# Altium footprint library Lib_001.PcbLib: 429 footprints (part 13 of 28)
Each footprint in its own frame and in the unit in brackets; x right, y up, seen from the top. Pads: shape width x height; smd on the part's side, far side on the other; paste and mask are expansions set on the pad; w line width, h text height; cw(c..) or ccw(c..) is an arc to the next point about the centre after c.
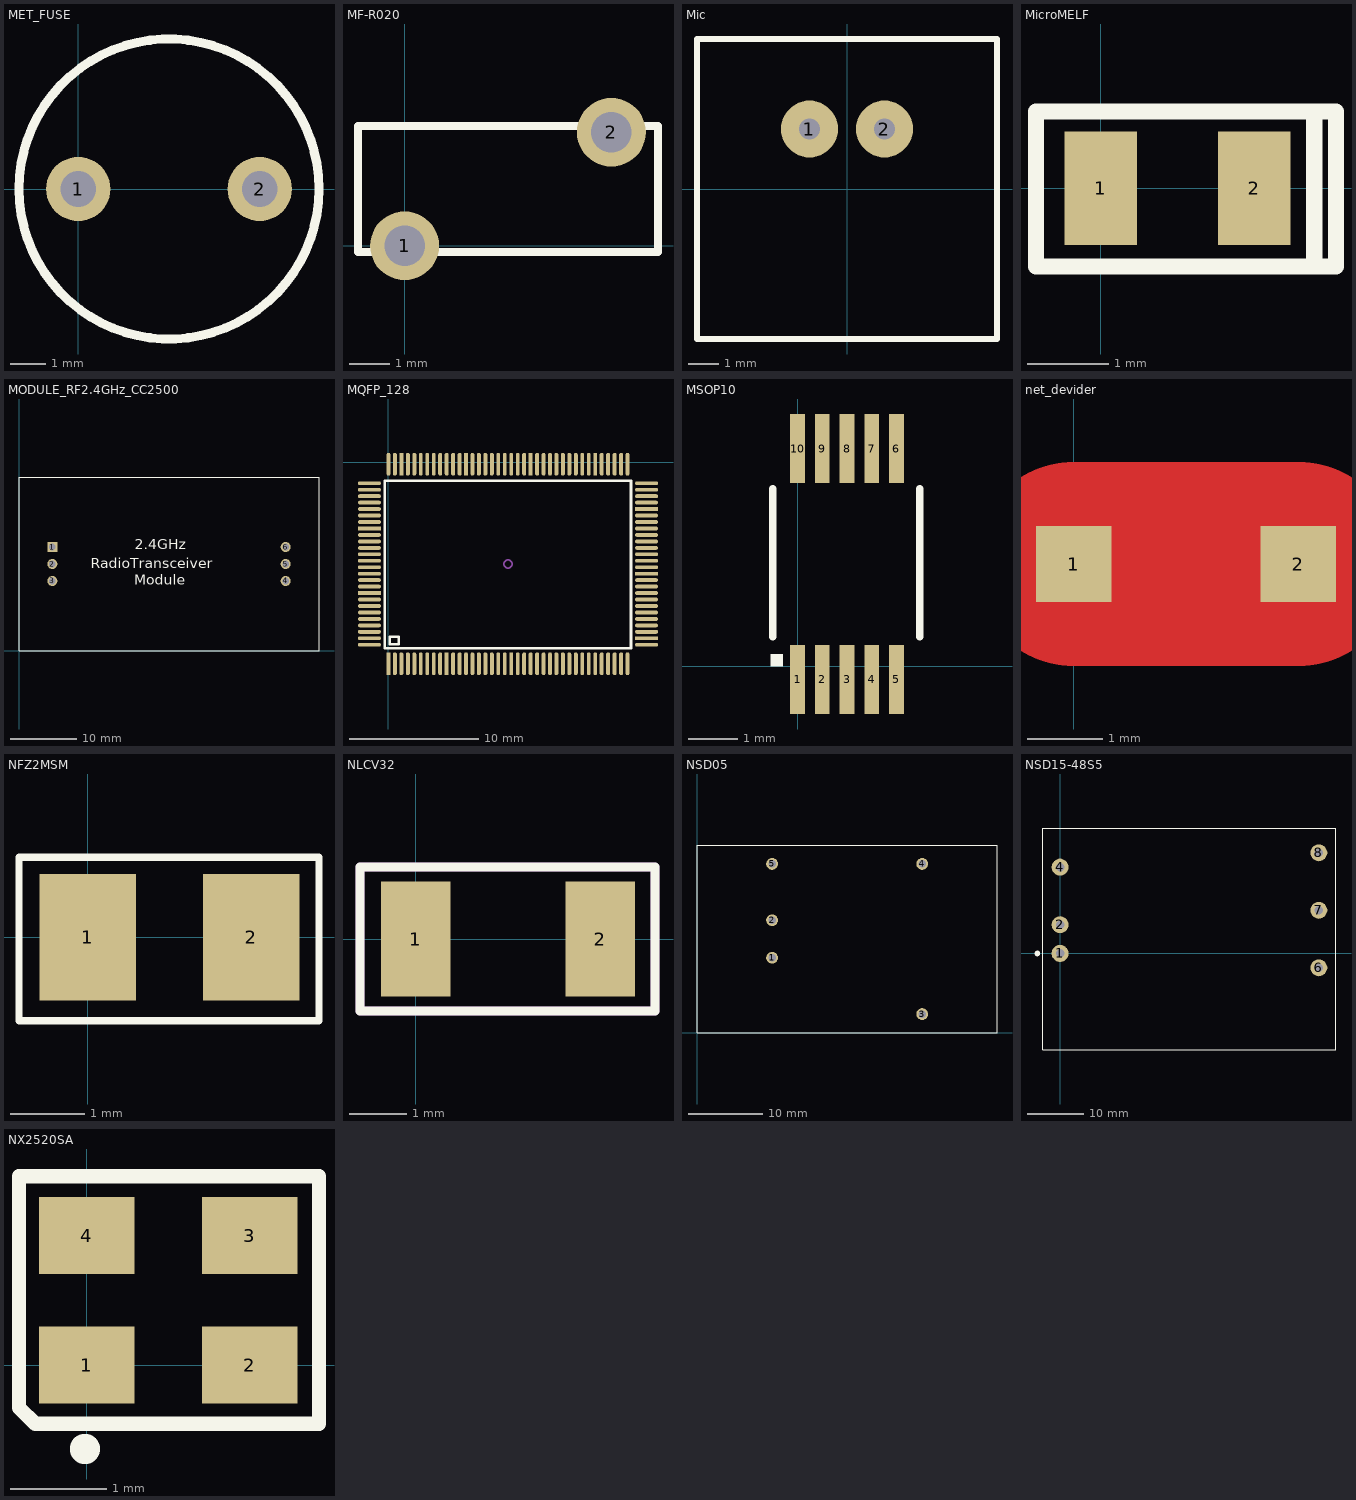
[diagram p12: the footprints below, top view; thin cyan lines are the x and y axes]

## MECH_radiator_90x18 [mm]
height 12
3D body "Радиатор_MIS.STEP": height 18.2, standoff 1.2, extent 0.004,0.01 90.004,18.01

## MECH_radiator_G30x10 [mm]
height 20
3D body "Радиатор_Г30х10.STEP": height 20, standoff 0, extent -31,0 0,11

## MECH_radiator_R30x10 [mm]
height 20
3D body "Радиатор_Р30х10.STEP": height 20, standoff 0, extent 0,0 30,12

## MET_FUSE [mm] "8х8 мм, Предохранитель"
pads (2):
  round 1.8 hole 1: 1(0,0) 2(5.08,0)
Top Overlay:
  circle w0.254: c2.54,0 r4.2
3D body: height 10.7, standoff 3, extent -1.627,-4.192 6.74,4.192
3D body: height 4, standoff -1, extent -0.307,-0.309 0.31,0.31
3D body: height 4, standoff -1, extent 4.773,-0.309 5.39,0.31

## MF-R020 [mm]
pads (2):
  round 1.7 hole 1: 1(0,0) 2(5.1,2.8)
Top Overlay:
  lines w0.2: -1.15,-0.15 6.25,-0.15 6.25,1.4 6.25,2.95 -1.15,2.95 -1.15,1.4 -1.15,-0.15

## Mic [mm] "Microphone"
pads (2):
  round 1.9 hole 0.7: 1(-1.25,2) 2(1.25,2)
Top Overlay:
  lines w0.2: -5,-5 5,-5 5,5 -5,5 -5,-5
3D body "CMA-4544.step": height 5.6, standoff -3.5, extent -4.85,-4.85 4.848,4.848

## MicroMELF [mm]
pads (2):
  rect 0.9x1.4 smd: 1(0,0) 2(1.9,0)
Top Overlay:
  lines w0.2: 2.64,-0.96 2.64,0.92 ; -0.8,-0.97 2.91,-0.97 2.91,0.95 -0.8,0.95 -0.8,-0.97
3D body "User Library-MicroMelf.step": height 1.17, standoff 0.03, extent -0.015,-0.57 1.915,0.573

## MODULE_RF2.4GHz_CC2500 [mm]
pads (6):
  rect 1.5x1.5 hole 1: 1(5,15.54)
  round 1.5 hole 1: 2(5,13) 3(5,10.46) 4(40,10.46) 5(40,13) 6(40,15.54)
Top Overlay:
  lines w0.1: 0,0 0,26 45,26 45,0 0,0
  text "2.4GHz" at 17.36,15.22 h1.52
  text "RadioTransceiver" at 10.75,12.36 h1.52
  text "Module" at 17.32,9.9 h1.52

## MQFP_128 [mil]
pads (128):
  rect 11.81x70 smd: 1(1.3,-615.24) 10(178.6,-615.24) 20(375.6,-615.24) 70(631.7,-6.74) 80(434.7,-6.74) 90(237.7,-6.74) 100(40.7,-6.74)
  oval 11.81x70 smd: 2(21,-615.24) 3(40.7,-615.24) 4(60.4,-615.24) 5(80.1,-615.24) 6(99.8,-615.24) 7(119.5,-615.24) 8(139.2,-615.24) 9(158.9,-615.24) 11(198.3,-615.24) 12(218,-615.24) 13(237.7,-615.24) 14(257.4,-615.24) 15(277.1,-615.24) 16(296.8,-615.24) 17(316.5,-615.24) 18(336.2,-615.24) 19(355.9,-615.24) 21(395.3,-615.24) 22(415,-615.24) 23(434.7,-615.24) 24(454.4,-615.24) 25(474.1,-615.24) 26(493.8,-615.24) 27(513.5,-615.24) 28(533.2,-615.24) 29(552.9,-615.24) 30(572.6,-615.24) 31(592.3,-615.24) 32(612,-615.24) 33(631.7,-615.24) 34(651.4,-615.24) 35(671.1,-615.24) 36(690.8,-615.24) 37(710.5,-615.24) 38(730.2,-615.24) 65(730.2,-6.74) 66(710.5,-6.74) 67(690.8,-6.74) 68(671.1,-6.74) 69(651.4,-6.74) 71(612,-6.74) 72(592.3,-6.74) 73(572.6,-6.74) 74(552.9,-6.74) 75(533.2,-6.74) 76(513.5,-6.74) 77(493.8,-6.74) 78(474.1,-6.74) 79(454.4,-6.74) 81(415,-6.74) 82(395.3,-6.74) 83(375.6,-6.74) 84(355.9,-6.74) 85(336.2,-6.74) 86(316.5,-6.74) 87(296.8,-6.74) 88(277.1,-6.74) 89(257.4,-6.74) 91(218,-6.74) 92(198.3,-6.74) 93(178.6,-6.74) 94(158.9,-6.74) 95(139.2,-6.74) 96(119.5,-6.74) 97(99.8,-6.74) 98(80.1,-6.74) 99(60.4,-6.74) 101(21,-6.74) 102(1.3,-6.74)
  oval 70x11.81 smd: 39(788.2,-557.24) 41(788.2,-517.84) 42(788.2,-498.14) 43(788.2,-478.44) 44(788.2,-458.74) 45(788.2,-439.04) 46(788.2,-419.34) 47(788.2,-399.64) 48(788.2,-379.94) 49(788.2,-360.24) 51(788.2,-320.84) 52(788.2,-301.14) 53(788.2,-281.44) 54(788.2,-261.74) 55(788.2,-242.04) 56(788.2,-222.34) 57(788.2,-202.64) 58(788.2,-182.94) 59(788.2,-163.24) 61(788.2,-123.84) 62(788.2,-104.14) 63(788.2,-84.44) 64(788.2,-64.74) 103(-56.7,-64.74) 104(-56.7,-84.44) 105(-56.7,-104.14) 106(-56.7,-123.84) 107(-56.7,-143.54) 108(-56.7,-163.24) 109(-56.7,-182.94) 111(-56.7,-222.34) 112(-56.7,-242.04) 113(-56.7,-261.74) 114(-56.7,-281.44) 115(-56.7,-301.14) 116(-56.7,-320.84) 117(-56.7,-340.54) 118(-56.7,-360.24) 119(-56.7,-379.94) 121(-56.7,-419.34) 122(-56.7,-439.04) 123(-56.7,-458.74) 124(-56.7,-478.44) 125(-56.7,-498.14) 126(-56.7,-517.84) 127(-56.7,-537.54) 128(-56.7,-557.24)
  rect 70x11.81 smd: 40(788.2,-537.54) 50(788.2,-340.54) 60(788.2,-143.54) 110(-56.7,-202.64) 120(-56.7,-399.64)
Top Overlay:
  lines w7.87: -2.63,-56.7 740.77,-56.7 740.77,-568.04 -10.5,-568.04 -10.5,-56.7 9.17,-56.7 ; 5.23,-556.24 5.23,-532.64 32.77,-532.64 32.77,-556.24 5.23,-556.24
Mechanical 3:
  lines w4: 353.2,-311.04 cw(c365.7,-311.04) 365.7,-298.54 cw(c365.7,-311.04) 378.2,-311.04 cw(c365.7,-311.04) 365.7,-323.54 cw(c365.7,-311.04) 353.2,-311.04

## MSOP10 [mm]
height 1.5
pads (10):
  rect 0.3x1.4 smd: 1(0,-0.263) 2(0.5,-0.263) 3(1,-0.263) 4(1.5,-0.263) 5(2,-0.263) 6(2,4.411) 7(1.5,4.411) 8(1,4.411) 9(0.5,4.411) 10(0,4.411)
Top Overlay:
  rectangle: -0.55,0 -0.3,0.25
  lines w0.15: -0.503,0.599 -0.503,3.597 ; 2.476,0.599 2.476,3.597
3D body "MSOP10.STEP": height 1.1, standoff 0, extent -0.5,-0.35 2.5,4.55

## net_devider [mm]
pads (2):
  rect 1x1 smd: 1(0,0) 2(2.972,0)
Top Layer:
  lines w2.7: 0,0 2.972,0

## NFZ2MSM [mm] "Filter"
height 0.5
pads (2):
  rect 1.3x1.7 smd: 1(0,0) 2(2.2,0)
Top Overlay:
  lines w0.1: -0.928,-1.121 -0.928,1.076 3.11,1.076 3.11,-1.121 -0.928,-1.121
3D body: height 1, standoff 0, extent 2.1,-0.804 2.6,0.812
3D body: height 1, standoff 0, extent -0.35,-0.786 0.1,0.817
3D body: height 1, standoff 0, extent 0.1,-0.814 2.1,0.823

## NLCV32 [mm]
pads (2):
  rect 1.2x2 smd: 1(0,0) 2(3.2,0)
Top Overlay:
  lines w0.152: -0.965,1.25 -0.965,-1.25 4.15,-1.25 4.15,1.25 -0.964,1.25
Mechanical 1:
  lines w0.152: -0.965,-1.25 -0.965,1.25 4.15,1.25 4.15,-1.25 -0.965,-1.25
3D body: height 2.2, standoff 0, extent -0.5,-1.25 3.7,1.25
3D body: height 1.5, standoff 0, extent -0.45,-0.6 0,0.6

## NSD05 [mm]
height 8.3
pads (5):
  round 1.6 hole 1: 1(10.16,10.16) 2(10.16,15.24) 3(30.48,2.54) 4(30.48,22.86) 5(10.16,22.86)
Top Overlay:
  lines w0.1: 0,0 0,25.4 40.6,25.4 40.6,0 0,0
3D body: height 5, standoff 0, extent 0,0 40.6,25.4

## NSD15-48S5 [mm] "MeanWell"
pads (6):
  round 3 hole 1.5: 1(0,0) 2(0,5.08) 4(0,15.24) 6(45.72,-2.54) 7(45.72,7.62) 8(45.72,17.78)
Top Overlay:
  circle w0.5: c-4,0 r0.25
  lines w0.2: -3.05,-17 48.75,-17 48.75,22.1 -3.05,22.1 -3.05,-17
3D body "NSD15-48S5.stp": height 9.82, standoff -5, extent -2.54,-16.51 48.26,21.59

## NX2520SA [mm] "A small and thin surface-mount type crystal unit"
pads (4):
  rect 1x0.8 smd: 1(0,0) 2(1.7,0) 3(1.7,1.35) 4(0,1.35)
Top Overlay:
  circle w0.254: c-0.018,-0.875 r0.031
  lines w0.15: -0.706,-0.444 -0.706,1.97 2.422,1.97 2.422,-0.613 -0.537,-0.613 -0.706,-0.444
3D body "User Library-NX2520SA.step": height 0.65, standoff 0, extent -0.401,-0.331 2.101,1.671